# Altium schematic symbol library AliPadash.SchLib: 1186 symbols (part 3 of 6)
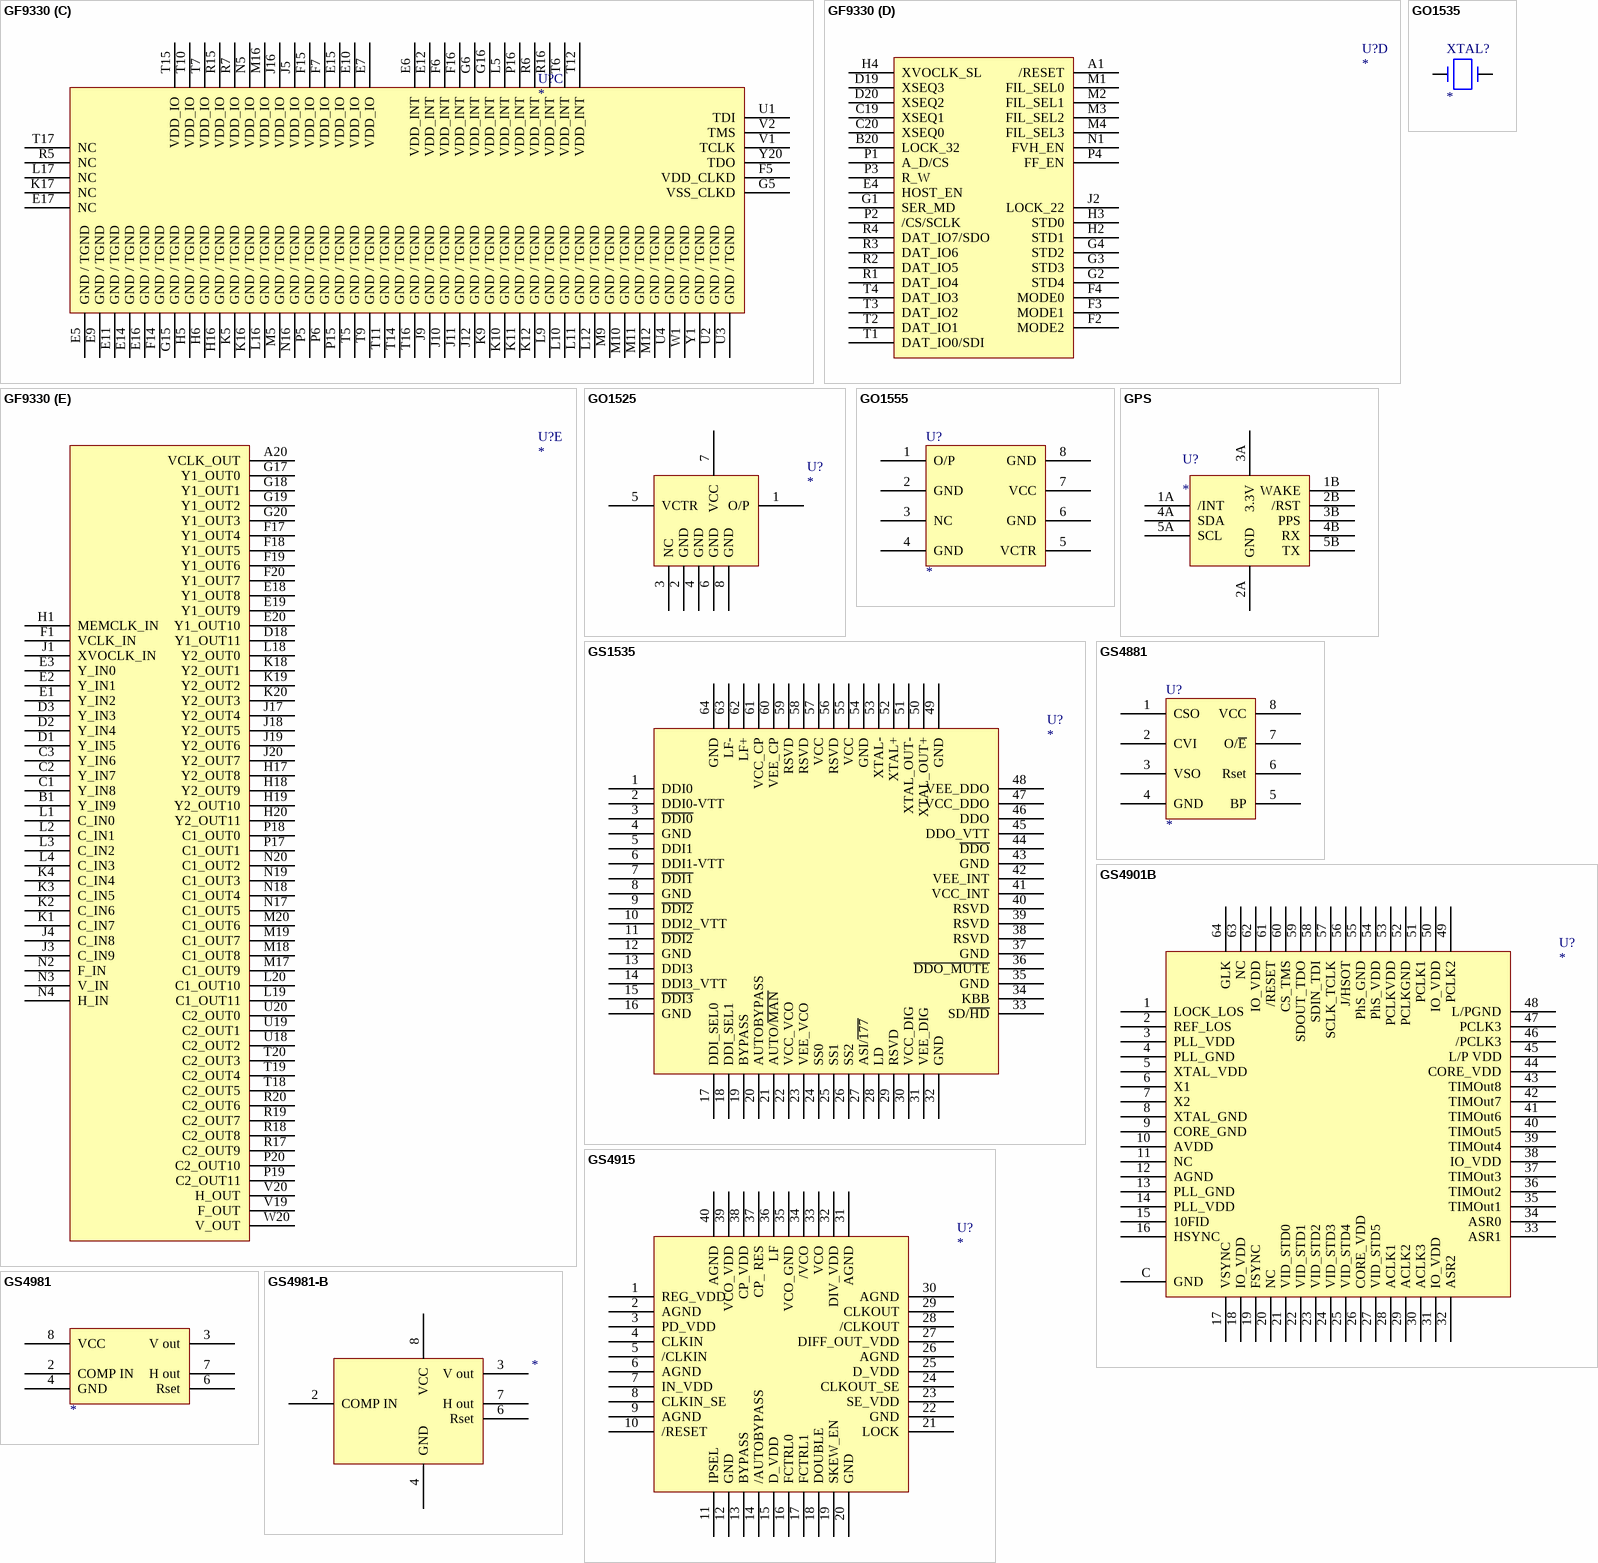
[diagram p88: symbols GF9330 to GS4981-B]

## GF9330
designator U?
footprint BGA320X20
part A pins: T8 S1_DAT41, T13 S1_DAT25, U5 S1_ADDR6, U6 S1_ADDR2, U7 S1_DAT46, U8 S1_DAT42, U9 S1_DAT37, U10 S1_DAT34, U11 S1_DAT33, U12 S1_DAT29, U13 S1_DAT24, U14 S1_DAT20, U15 S1_DAT16, U16 S1_DAT12, U17 S1_DAT8, V3 S1_ADDR13, V4 S1_ADDR10, V5 S1_ADDR7, V6 S1_ADDR3, V7 S1_DAT47, V8 S1_DAT43, V9 S1_DAT38, V10 S1_DAT35, V11 S1_DAT32, V12 S1_DAT28, V13 S1_DAT23, V14 S1_DAT19, V15 S1_DAT15, V16 S1_DAT11, V17 S1_DAT7, V18 S1_DAT4, W2 /S1_RAS, W3 /S1_CAS, W4 S1_ADDR11, W5 S1_ADDR8, W6 S1_ADDR4, W7 S1_ADDR0, W8 S1_DAT44, W9 S1_DAT39, W10 S1_DAT36, W11 S1_DAT31, W12 S1_DAT27, W13 S1_DAT22, W14 S1_DAT18, W15 S1_DAT14, W16 S1_DAT10, W17 S1_DAT6, W18 S1_DAT3, W19 S1_DAT1, Y2 /S1_WE, Y3 /S1_CS, Y4 S1_ADDR12, Y5 S1_ADDR9, Y6 S1_ADDR5, Y7 S1_ADDR1, Y8 S1_DAT45, Y9 S1_DAT40, Y10 S1_CLK, Y11 S1_DAT30, Y12 S1_DAT26, Y13 S1_DAT21, Y14 S1_DAT17, Y15 S1_DAT13, Y16 S1_DAT9, Y17 S1_DAT5, Y18 S1_DAT2, Y19 S1_DAT0
part B pins: A2 S2_DAT0, A3 S2_DAT2, A4 S2_DAT4, A5 S2_DAT8, A6 S2_DAT12, A7 S2_DAT16, A8 S2_DAT20, A9 S2_DAT25, A10 S2_DAT29, A11 S2_DAT36, A12 S2_CLK, A13 S2_DAT44, A14 S2_ADDR0, A15 S2_ADDR4, A16 S2_ADDR8, A17 S2_ADDR12, A18 /S2_CS, A19 /S2_WE, B2 S2_DAT1, B3 S2_DAT3, B4 S2_DAT5, B5 S2_DAT9, B6 S2_DAT13, B7 S2_DAT17, B8 S2_DAT21, B9 S2_DAT26, B10 S2_DAT30, B11 S2_DAT35, B12 S2_DAT39, B13 S2_DAT43, B14 S2_DAT47, B15 S2_ADDR3, B16 S2_ADDR7, B17 S2_ADDR11, B18 /S2_CAS, B19 /S2_RAS, C4 S2_DAT6, C5 S2_DAT10, C6 S2_DAT14, C7 S2_DAT18, C8 S2_DAT22, C9 S2_DAT27, C10 S2_DAT31, C11 S2_DAT34, C12 S2_DAT38, C13 S2_DAT42, C14 S2_DAT46, C15 S2_ADDR2, C16 S2_ADDR6, C17 S2_ADDR10, C18 S2_ADDR13, D4 S2_DAT7, D5 S2_DAT11, D6 S2_DAT15, D7 S2_DAT19, D8 S2_DAT23, D9 S2_DAT28, D10 S2_DAT32, D11 S2_DAT33, D12 S2_DAT37, D13 S2_DAT41, D14 S2_DAT45, D15 S2_ADDR1, D16 S2_ADDR5, D17 S2_ADDR9, E8 S2_DAT24, E13 S2_DAT40
part C pins: E5 GND / TGND, E6 VDD_INT, E7 VDD_IO, E9 GND / TGND, E10 VDD_IO, E11 GND / TGND, E12 VDD_INT, E14 GND / TGND, E15 VDD_IO, E16 GND / TGND, E17 NC, F5 VDD_CLKD, F6 VDD_INT, F7 VDD_IO, F14 GND / TGND, F15 VDD_IO, F16 VDD_INT, G5 VSS_CLKD, G6 VDD_INT, G15 GND / TGND, G16 VDD_INT, H5 GND / TGND, H6 GND / TGND, H16 GND / TGND, J5 VDD_IO, J9 GND / TGND, J10 GND / TGND, J11 GND / TGND, J12 GND / TGND, J16 VDD_IO, K5 GND / TGND, K9 GND / TGND, K10 GND / TGND, K11 GND / TGND, K12 GND / TGND, K16 GND / TGND, K17 NC, L5 VDD_INT, L9 GND / TGND, L10 GND / TGND, L11 GND / TGND, L12 GND / TGND, L16 GND / TGND, L17 NC, M5 GND / TGND, M9 GND / TGND, M10 GND / TGND, M11 GND / TGND, M12 GND / TGND, M16 VDD_IO, N5 VDD_IO, N16 GND / TGND, P5 GND / TGND, P6 GND / TGND, P15 GND / TGND, P16 VDD_INT, R5 NC, R6 VDD_INT, R7 VDD_IO, R15 VDD_IO, R16 VDD_INT, T5 GND / TGND, T6 VDD_INT, T7 VDD_IO, T9 GND / TGND, T10 VDD_IO, T11 GND / TGND, T12 VDD_INT, T14 GND / TGND, T15 VDD_IO, T16 GND / TGND, T17 NC, U1 TDI, U2 GND / TGND, U3 GND / TGND, U4 GND / TGND, V1 TCLK, V2 TMS, W1 GND / TGND, Y1 GND / TGND, Y20 TDO
part D pins: A1 /RESET, B20 LOCK_32, C19 XSEQ1, C20 XSEQ0, D19 XSEQ3, D20 XSEQ2, E4 HOST_EN, F2 MODE2, F3 MODE1, F4 MODE0, G1 SER_MD, G2 STD4, G3 STD3, G4 STD2, H2 STD1, H3 STD0, H4 XVOCLK_SL, J2 LOCK_22, M1 FIL_SEL0, M2 FIL_SEL1, M3 FIL_SEL2, M4 FIL_SEL3, N1 FVH_EN, P1 A_D/CS, P2 /CS/SCLK, P3 R_W, P4 FF_EN, R1 DAT_IO4, R2 DAT_IO5, R3 DAT_IO6, R4 DAT_IO7/SDO, T1 DAT_IO0/SDI, T2 DAT_IO1, T3 DAT_IO2, T4 DAT_IO3
part E pins: A20 VCLK_OUT, B1 Y_IN9, C1 Y_IN8, C2 Y_IN7, C3 Y_IN6, D1 Y_IN5, D2 Y_IN4, D3 Y_IN3, D18 Y1_OUT11, E1 Y_IN2, E2 Y_IN1, E3 Y_IN0, E18 Y1_OUT8, E19 Y1_OUT9, E20 Y1_OUT10, F1 VCLK_IN, F17 Y1_OUT4, F18 Y1_OUT5, F19 Y1_OUT6, F20 Y1_OUT7, G17 Y1_OUT0, G18 Y1_OUT1, G19 Y1_OUT2, G20 Y1_OUT3, H1 MEMCLK_IN, H17 Y2_OUT8, H18 Y2_OUT9, H19 Y2_OUT10, H20 Y2_OUT11, J1 XVOCLK_IN, J3 C_IN9, J4 C_IN8, J17 Y2_OUT4, J18 Y2_OUT5, J19 Y2_OUT6, J20 Y2_OUT7, K1 C_IN7, K2 C_IN6, K3 C_IN5, K4 C_IN4, K18 Y2_OUT1, K19 Y2_OUT2, K20 Y2_OUT3, L1 C_IN0, L2 C_IN1, L3 C_IN2, L4 C_IN3, L18 Y2_OUT0, L19 C1_OUT11, L20 C1_OUT10, M17 C1_OUT9, M18 C1_OUT8, M19 C1_OUT7, M20 C1_OUT6, N2 F_IN, N3 V_IN, N4 H_IN, N17 C1_OUT5, N18 C1_OUT4, N19 C1_OUT3, N20 C1_OUT2, P17 C1_OUT1, P18 C1_OUT0, P19 C2_OUT11, P20 C2_OUT10, R17 C2_OUT9, R18 C2_OUT8, R19 C2_OUT7, R20 C2_OUT6, T18 C2_OUT5, T19 C2_OUT4, T20 C2_OUT3, U18 C2_OUT2, U19 C2_OUT1, U20 C2_OUT0, V19 F_OUT, V20 H_OUT, W20 V_OUT

## GO1525
designator U?
footprint TOR-8
pins: 1 O/P, 2 GND, 3 NC, 4 GND, 5 VCTR, 6 GND, 7 VCC, 8 GND

## GO1535
designator XTAL?
footprint GO4
pins: 1, 3

## GO1555
designator U?
footprint PSML8
pins: 1 O/P, 2 GND, 3 NC, 4 GND, 5 VCTR, 6 GND, 7 VCC, 8 GND

## GPS
designator U?
footprint GPS-QWIIC
pins: 1A /INT, 1B WAKE, 2A GND, 2B /RST, 3A 3.3V, 3B PPS, 4A SDA, 4B RX, 5A SCL, 5B TX

## GS1535
designator U?
footprint ST-64B
pins: 1 DDI0, 2 DDI0-VTT, 3 ~{DDI0}, 4 GND, 5 DDI1, 6 DDI1-VTT, 7 ~{DDI1}, 8 GND, 9 ~{DDI2}, 10 DDI2_VTT, 11 ~{DDI2}, 12 GND, 13 DDI3, 14 DDI3_VTT, 15 ~{DDI3}, 16 GND, 17 DDI_SEL0, 18 DDI_SEL1, 19 BYPASS, 20 AUTOBYPASS, 21 AUTO/~{MAN}, 22 VCC_VCO, 23 VEE_VCO, 24 SS0, 25 SS1, 26 SS2, 27 ASI/~{177}, 28 LD, 29 RSVD, 30 VCC_DIG, 31 VEE_DIG, 32 GND, 33 SD/~{HD}, 34 KBB, 35 GND, 36 ~{DDO_MUTE}, 37 GND, 38 RSVD, 39 RSVD, 40 RSVD, 41 VCC_INT, 42 VEE_INT, 43 GND, 44 ~{DDO}, 45 DDO_VTT, 46 DDO, 47 VCC_DDO, 48 VEE_DDO, 49 GND, 50 XTAL_OUT+, 51 XTAL_OUT-, 52 XTAL+, 53 XTAL-, 54 GND, 55 VCC, 56 RSVD, 57 VCC, 58 RSVD, 59 RSVD, 60 VEE_CP, 61 VCC_CP, 62 LF+, 63 LF-, 64 GND

## GS4881
designator U?
footprint DIP8
pins: 1 CSO, 2 CVI, 3 VSO, 4 GND, 5 BP, 6 Rset, 7 O/~{E}, 8 VCC

## GS4901B
designator U?
footprint QFN64
pins: 1 LOCK_LOS, 2 REF_LOS, 3 PLL_VDD, 4 PLL_GND, 5 XTAL_VDD, 6 X1, 7 X2, 8 XTAL_GND, 9 CORE_GND, 10 AVDD, 11 NC, 12 AGND, 13 PLL_GND, 14 PLL_VDD, 15 10FID, 16 HSYNC, 17 VSYNC, 18 IO_VDD, 19 FSYNC, 20 NC, 21 VID_STD0, 22 VID_STD1, 23 VID_STD2, 24 VID_STD3, 25 VID_STD4, 26 CORE_VDD, 27 VID_STD5, 28 ACLK1, 29 ACLK2, 30 ACLK3, 31 IO_VDD, 32 ASR2, 33 ASR1, 34 ASR0, 35 TIMOut1, 36 TIMOut2, 37 TIMOut3, 38 IO_VDD, 39 TIMOut4, 40 TIMOut5, 41 TIMOut6, 42 TIMOut7, 43 TIMOut8, 44 CORE_VDD, 45 L/P VDD, 46 /PCLK3, 47 PCLK3, 48 L/PGND, 49 PCLK2, 50 IO_VDD, 51 PCLK1, 52 PCLKGND, 53 PCLKVDD, 54 PhS_VDD, 55 PhS_GND, 56 J/HSOT, 57 SCLK_TCLK, 58 SDIN_TDI, 59 SDOUT_TDO, 60 CS_TMS, 61 /RESET, 62 IO_VDD, 63 NC, 64 GLK, C GND

## GS4915
designator U?
footprint QFN40
pins: 1 REG_VDD, 2 AGND, 3 PD_VDD, 4 CLKIN, 5 /CLKIN, 6 AGND, 7 IN_VDD, 8 CLKIN_SE, 9 AGND, 10 /RESET, 11 IPSEL, 12 GND, 13 BYPASS, 14 /AUTOBYPASS, 15 D_VDD, 16 FCTRL0, 17 FCTRL1, 18 DOUBLE, 19 SKEW_EN, 20 GND, 21 LOCK, 22 GND, 23 SE_VDD, 24 CLKOUT_SE, 25 D_VDD, 26 AGND, 27 DIFF_OUT_VDD, 28 /CLKOUT, 29 CLKOUT, 30 AGND, 31 AGND, 32 DIV_VDD, 33 VCO, 34 /VCO, 35 VCO_GND, 36 LF, 37 CP_ RES, 38 CP_VDD, 39 VCO_VDD, 40 AGND

## GS4981
designator ?
pins: 2 COMP IN, 3 V out, 4 GND, 6 Rset, 7 H out, 8 VCC

## GS4981-B
designator ?
pins: 2 COMP IN, 3 V out, 4 GND, 6 Rset, 7 H out, 8 VCC

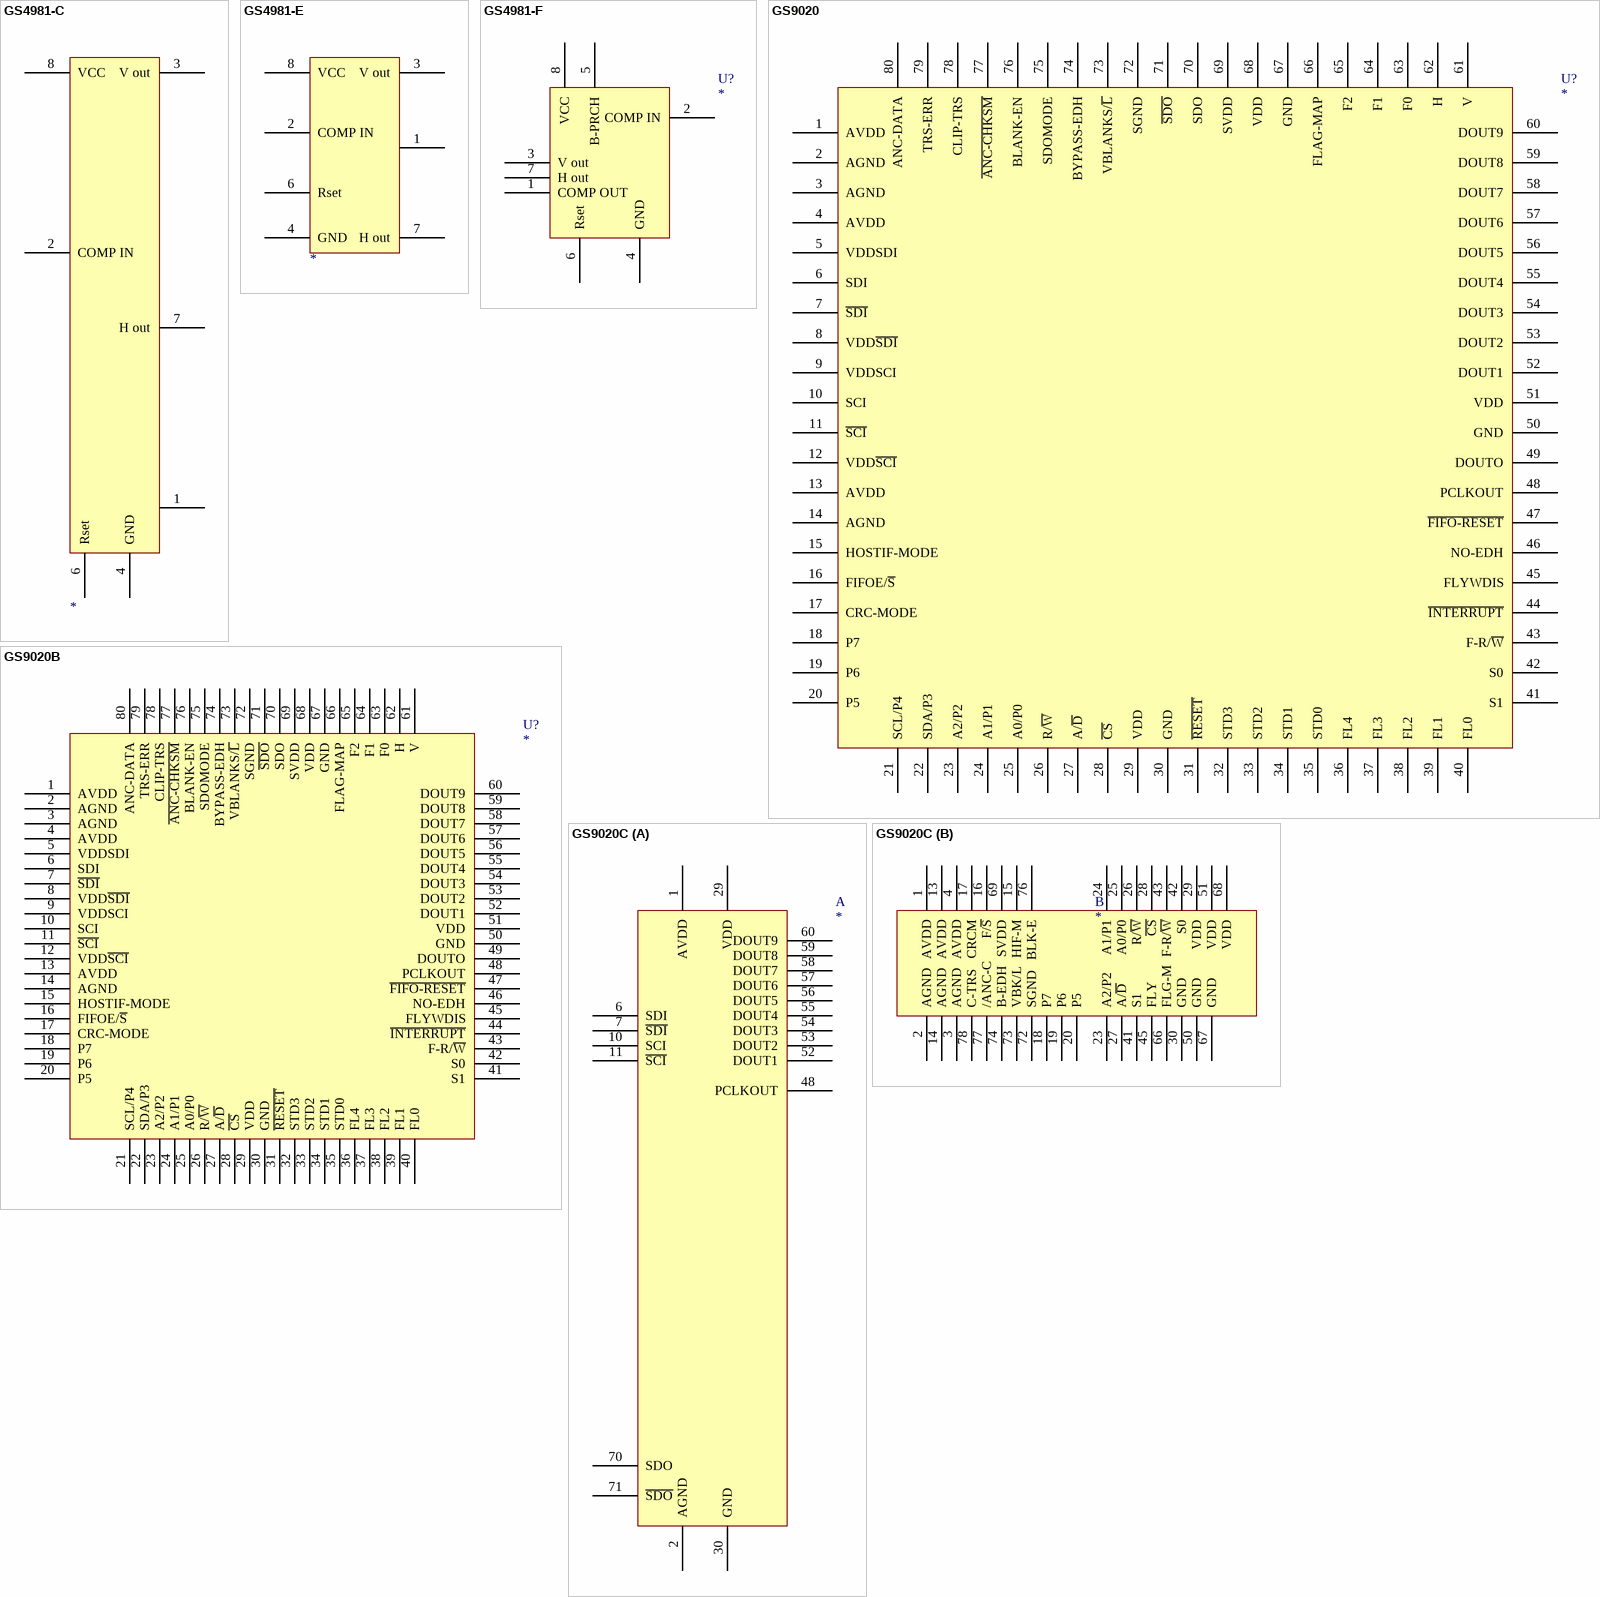
[diagram p28: symbols GS4981-C to GS9020C]

## GS4981-C
designator ?
pins: 1, 2 COMP IN, 3 V out, 4 GND, 6 Rset, 7 H out, 8 VCC

## GS4981-E
designator ?
pins: 1, 2 COMP IN, 3 V out, 4 GND, 6 Rset, 7 H out, 8 VCC

## GS4981-F
designator U?
pins: 1 COMP OUT, 2 COMP IN, 3 V out, 4 GND, 5 B-PRCH, 6 Rset, 7 H out, 8 VCC

## GS9020
designator U?
footprint TQFP80-A
pins: 1 AVDD (power), 2 AGND (power), 3 AGND (power), 4 AVDD (power), 5 VDDSDI, 6 SDI, 7 ~{SDI}, 8 VDD~{SDI}, 9 VDDSCI, 10 SCI, 11 ~{SCI}, 12 VDD~{SCI}, 13 AVDD (power), 14 AGND (power), 15 HOSTIF-MODE, 16 FIFOE/~{S}, 17 CRC-MODE, 18 P7, 19 P6, 20 P5, 21 SCL/P4, 22 SDA/P3, 23 A2/P2, 24 A1/P1, 25 A0/P0, 26 R/~{W}, 27 A/~{D}, 28 ~{CS}, 29 VDD (power), 30 GND (power), 31 ~{RESET}, 32 STD3, 33 STD2, 34 STD1, 35 STD0, 36 FL4, 37 FL3, 38 FL2, 39 FL1, 40 FL0, 41 S1, 42 S0, 43 F-R/~{W}, 44 ~{INTERRUPT}, 45 FLYWDIS, 46 NO-EDH, 47 ~{FIFO-RESET}, 48 PCLKOUT, 49 DOUTO, 50 GND (power), 51 VDD (power), 52 DOUT1, 53 DOUT2, 54 DOUT3, 55 DOUT4, 56 DOUT5, 57 DOUT6, 58 DOUT7, 59 DOUT8, 60 DOUT9, 61 V, 62 H, 63 F0, 64 F1, 65 F2, 66 FLAG-MAP, 67 GND (power), 68 VDD (power), 69 SVDD, 70 SDO, 71 ~{SDO}, 72 SGND, 73 VBLANKS/~{L}, 74 BYPASS-EDH, 75 SDOMODE, 76 BLANK-EN, 77 ~{ANC-CHKSM}, 78 CLIP-TRS, 79 TRS-ERR, 80 ANC-DATA

## GS9020B
designator U?
footprint TQFP80-A
pins: 1 AVDD (power), 2 AGND (power), 3 AGND (power), 4 AVDD (power), 5 VDDSDI, 6 SDI, 7 ~{SDI}, 8 VDD~{SDI}, 9 VDDSCI, 10 SCI, 11 ~{SCI}, 12 VDD~{SCI}, 13 AVDD (power), 14 AGND (power), 15 HOSTIF-MODE, 16 FIFOE/~{S}, 17 CRC-MODE, 18 P7, 19 P6, 20 P5, 21 SCL/P4, 22 SDA/P3, 23 A2/P2, 24 A1/P1, 25 A0/P0, 26 R/~{W}, 27 A/~{D}, 28 ~{CS}, 29 VDD (power), 30 GND (power), 31 ~{RESET}, 32 STD3, 33 STD2, 34 STD1, 35 STD0, 36 FL4, 37 FL3, 38 FL2, 39 FL1, 40 FL0, 41 S1, 42 S0, 43 F-R/~{W}, 44 ~{INTERRUPT}, 45 FLYWDIS, 46 NO-EDH, 47 ~{FIFO-RESET}, 48 PCLKOUT, 49 DOUTO, 50 GND (power), 51 VDD (power), 52 DOUT1, 53 DOUT2, 54 DOUT3, 55 DOUT4, 56 DOUT5, 57 DOUT6, 58 DOUT7, 59 DOUT8, 60 DOUT9, 61 V, 62 H, 63 F0, 64 F1, 65 F2, 66 FLAG-MAP, 67 GND (power), 68 VDD (power), 69 SVDD, 70 SDO, 71 ~{SDO}, 72 SGND, 73 VBLANKS/~{L}, 74 BYPASS-EDH, 75 SDOMODE, 76 BLANK-EN, 77 ~{ANC-CHKSM}, 78 CLIP-TRS, 79 TRS-ERR, 80 ANC-DATA

## GS9020C
designator ?
part A pins: 1 AVDD (power), 2 AGND (power), 6 SDI, 7 ~{SDI}, 10 SCI, 11 ~{SCI}, 29 VDD (power), 30 GND (power), 48 PCLKOUT, 52 DOUT1, 53 DOUT2, 54 DOUT3, 55 DOUT4, 56 DOUT5, 57 DOUT6, 58 DOUT7, 59 DOUT8, 60 DOUT9, 70 SDO, 71 ~{SDO}
part B pins: 1 AVDD (power), 2 AGND (power), 3 AGND (power), 4 AVDD (power), 13 AVDD (power), 14 AGND (power), 15 HIF-M, 16 F/~{S}, 17 CRCM, 18 P7, 19 P6, 20 P5, 23 A2/P2, 24 A1/P1, 25 A0/P0, 26 R/~{W}, 27 A/~{D}, 28 ~{CS}, 29 VDD (power), 30 GND (power), 41 S1, 42 S0, 43 F-R/~{W}, 45 FLY, 50 GND (power), 51 VDD (power), 66 FLG-M, 67 GND (power), 68 VDD (power), 69 SVDD, 72 SGND, 73 VBK/L, 74 B-EDH, 76 BLK-E, 77 /ANC-C, 78 C-TRS

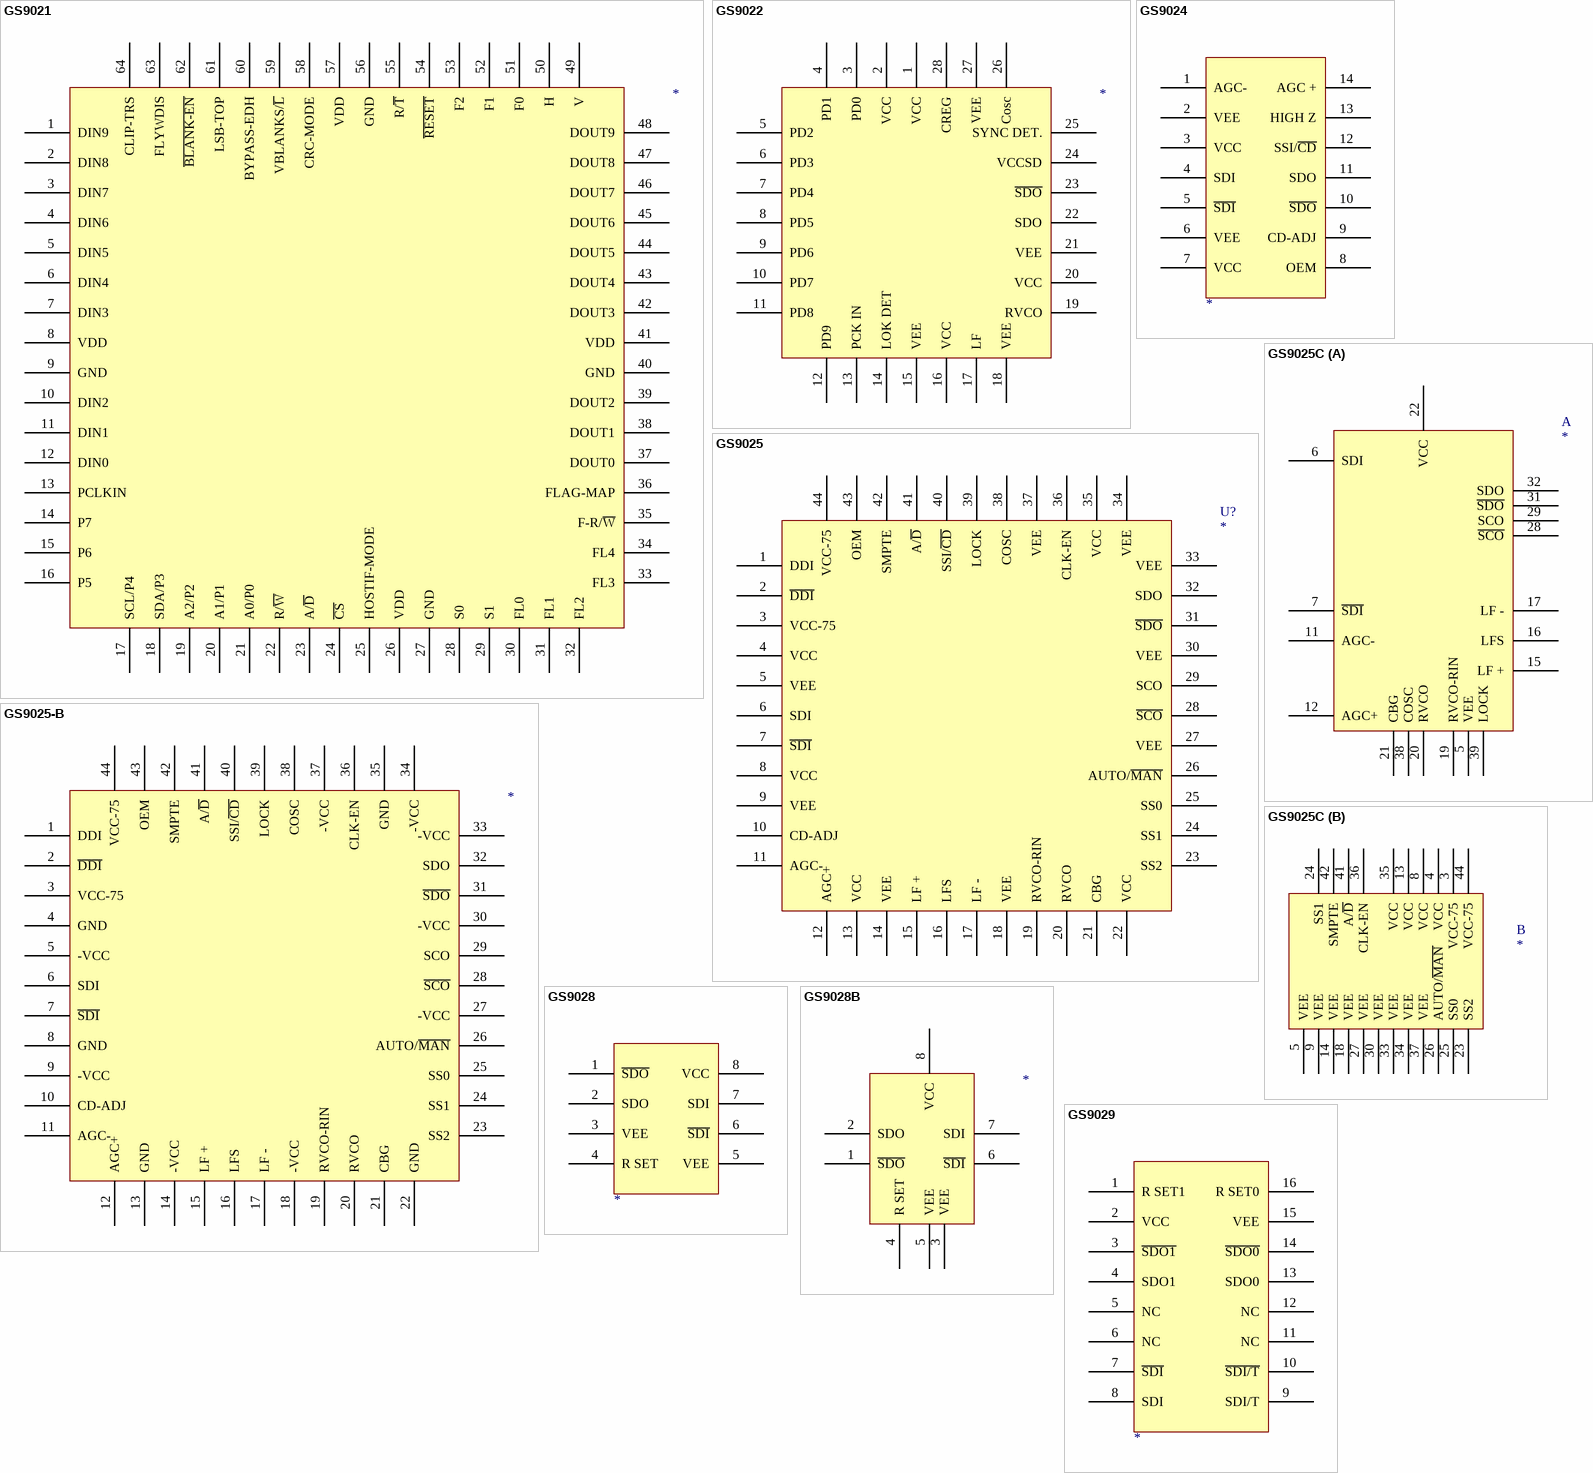
[diagram p29: symbols GS9021 to GS9029]

## GS9021
designator ?
U?
footprint LQFP64
pins: 1 DIN9, 2 DIN8, 3 DIN7, 4 DIN6, 5 DIN5, 6 DIN4, 7 DIN3, 8 VDD (power), 9 GND (power), 10 DIN2, 11 DIN1, 12 DIN0, 13 PCLKIN, 14 P7, 15 P6, 16 P5, 17 SCL/P4, 18 SDA/P3, 19 A2/P2, 20 A1/P1, 21 A0/P0, 22 R/~{W}, 23 A/~{D}, 24 ~{CS}, 25 HOSTIF-MODE, 26 VDD (power), 27 GND (power), 28 S0, 29 S1, 30 FL0, 31 FL1, 32 FL2, 33 FL3, 34 FL4, 35 F-R/~{W}, 36 FLAG-MAP, 37 DOUT0, 38 DOUT1, 39 DOUT2, 40 GND (power), 41 VDD (power), 42 DOUT3, 43 DOUT4, 44 DOUT5, 45 DOUT6, 46 DOUT7, 47 DOUT8, 48 DOUT9, 49 V, 50 H, 51 F0, 52 F1, 53 F2, 54 ~{RESET}, 55 R/~{T}, 56 GND (power), 57 VDD (power), 58 CRC-MODE, 59 VBLANKS/~{L}, 60 BYPASS-EDH, 61 LSB-TOP, 62 ~{BLANK-EN}, 63 FLYWDIS, 64 CLIP-TRS

## GS9022
designator ?
U?
footprint PLCC28
pins: 1 VCC (power), 2 VCC (power), 3 PD0, 4 PD1, 5 PD2, 6 PD3, 7 PD4, 8 PD5, 9 PD6, 10 PD7, 11 PD8, 12 PD9, 13 PCK IN, 14 LOK DET, 15 VEE (power), 16 VCC (power), 17 LF, 18 VEE (power), 19 RVCO, 20 VCC (power), 21 VEE (power), 22 SDO, 23 ~{SDO}, 24 VCCSD, 25 SYNC DET., 26 Cosc, 27 VEE (power), 28 CREG

## GS9024
designator ?
U?
pins: 1 AGC-, 2 VEE, 3 VCC (power), 4 SDI, 5 ~{SDI}, 6 VEE, 7 VCC (power), 8 OEM, 9 CD-ADJ, 10 ~{SDO}, 11 SDO, 12 SSI/~{CD}, 13 HIGH Z, 14 AGC +

## GS9025
designator U?
footprint LQFP44
pins: 1 DDI, 2 ~{DDI}, 3 VCC-75, 4 VCC (power), 5 VEE (power), 6 SDI, 7 ~{SDI}, 8 VCC (power), 9 VEE (power), 10 CD-ADJ, 11 AGC-, 12 AGC+, 13 VCC (power), 14 VEE (power), 15 LF +, 16 LFS, 17 LF -, 18 VEE (power), 19 RVCO-RIN, 20 RVCO, 21 CBG, 22 VCC (power), 23 SS2, 24 SS1, 25 SS0, 26 AUTO/~{MAN}, 27 VEE (power), 28 ~{SCO}, 29 SCO, 30 VEE (power), 31 ~{SDO}, 32 SDO, 33 VEE (power), 34 VEE (power), 35 VCC (power), 36 CLK-EN, 37 VEE (power), 38 COSC, 39 LOCK, 40 SSI/~{CD}, 41 A/~{D}, 42 SMPTE, 43 OEM, 44 VCC-75

## GS9025-B
designator ?
pins: 1 DDI, 2 ~{DDI}, 3 VCC-75, 4 GND (power), 5 -VCC (power), 6 SDI, 7 ~{SDI}, 8 GND (power), 9 -VCC (power), 10 CD-ADJ, 11 AGC-, 12 AGC+, 13 GND (power), 14 -VCC (power), 15 LF +, 16 LFS, 17 LF -, 18 -VCC (power), 19 RVCO-RIN, 20 RVCO, 21 CBG, 22 GND (power), 23 SS2, 24 SS1, 25 SS0, 26 AUTO/~{MAN}, 27 -VCC (power), 28 ~{SCO}, 29 SCO, 30 -VCC (power), 31 ~{SDO}, 32 SDO, 33 -VCC (power), 34 -VCC (power), 35 GND (power), 36 CLK-EN, 37 -VCC (power), 38 COSC, 39 LOCK, 40 SSI/~{CD}, 41 A/~{D}, 42 SMPTE, 43 OEM, 44 VCC-75

## GS9025C
designator ?
part A pins: 5 VEE (power), 6 SDI, 7 ~{SDI}, 11 AGC-, 12 AGC+, 15 LF +, 16 LFS, 17 LF -, 19 RVCO-RIN, 20 RVCO, 21 CBG, 22 VCC (power), 28 ~{SCO}, 29 SCO, 31 ~{SDO}, 32 SDO, 38 COSC, 39 LOCK
part B pins: 3 VCC-75, 4 VCC (power), 5 VEE (power), 8 VCC (power), 9 VEE (power), 13 VCC (power), 14 VEE (power), 18 VEE (power), 23 SS2, 24 SS1, 25 SS0, 26 AUTO/~{MAN}, 27 VEE (power), 30 VEE (power), 33 VEE (power), 34 VEE (power), 35 VCC (power), 36 CLK-EN, 37 VEE (power), 41 A/~{D}, 42 SMPTE, 44 VCC-75

## GS9028
designator ?
U?
pins: 1 ~{SDO}, 2 SDO, 3 VEE (power), 4 R SET, 5 VEE (power), 6 ~{SDI}, 7 SDI, 8 VCC (power)

## GS9028B
designator ?
U?
pins: 1 ~{SDO}, 2 SDO, 3 VEE (power), 4 R SET, 5 VEE (power), 6 ~{SDI}, 7 SDI, 8 VCC (power)

## GS9029
designator ?
U?
pins: 1 R SET1, 2 VCC (power), 3 ~{SDO1}, 4 SDO1, 5 NC, 6 NC, 7 ~{SDI}, 8 SDI, 9 SDI/T, 10 ~{SDI/T}, 11 NC, 12 NC, 13 SDO0, 14 ~{SDO0}, 15 VEE (power), 16 R SET0

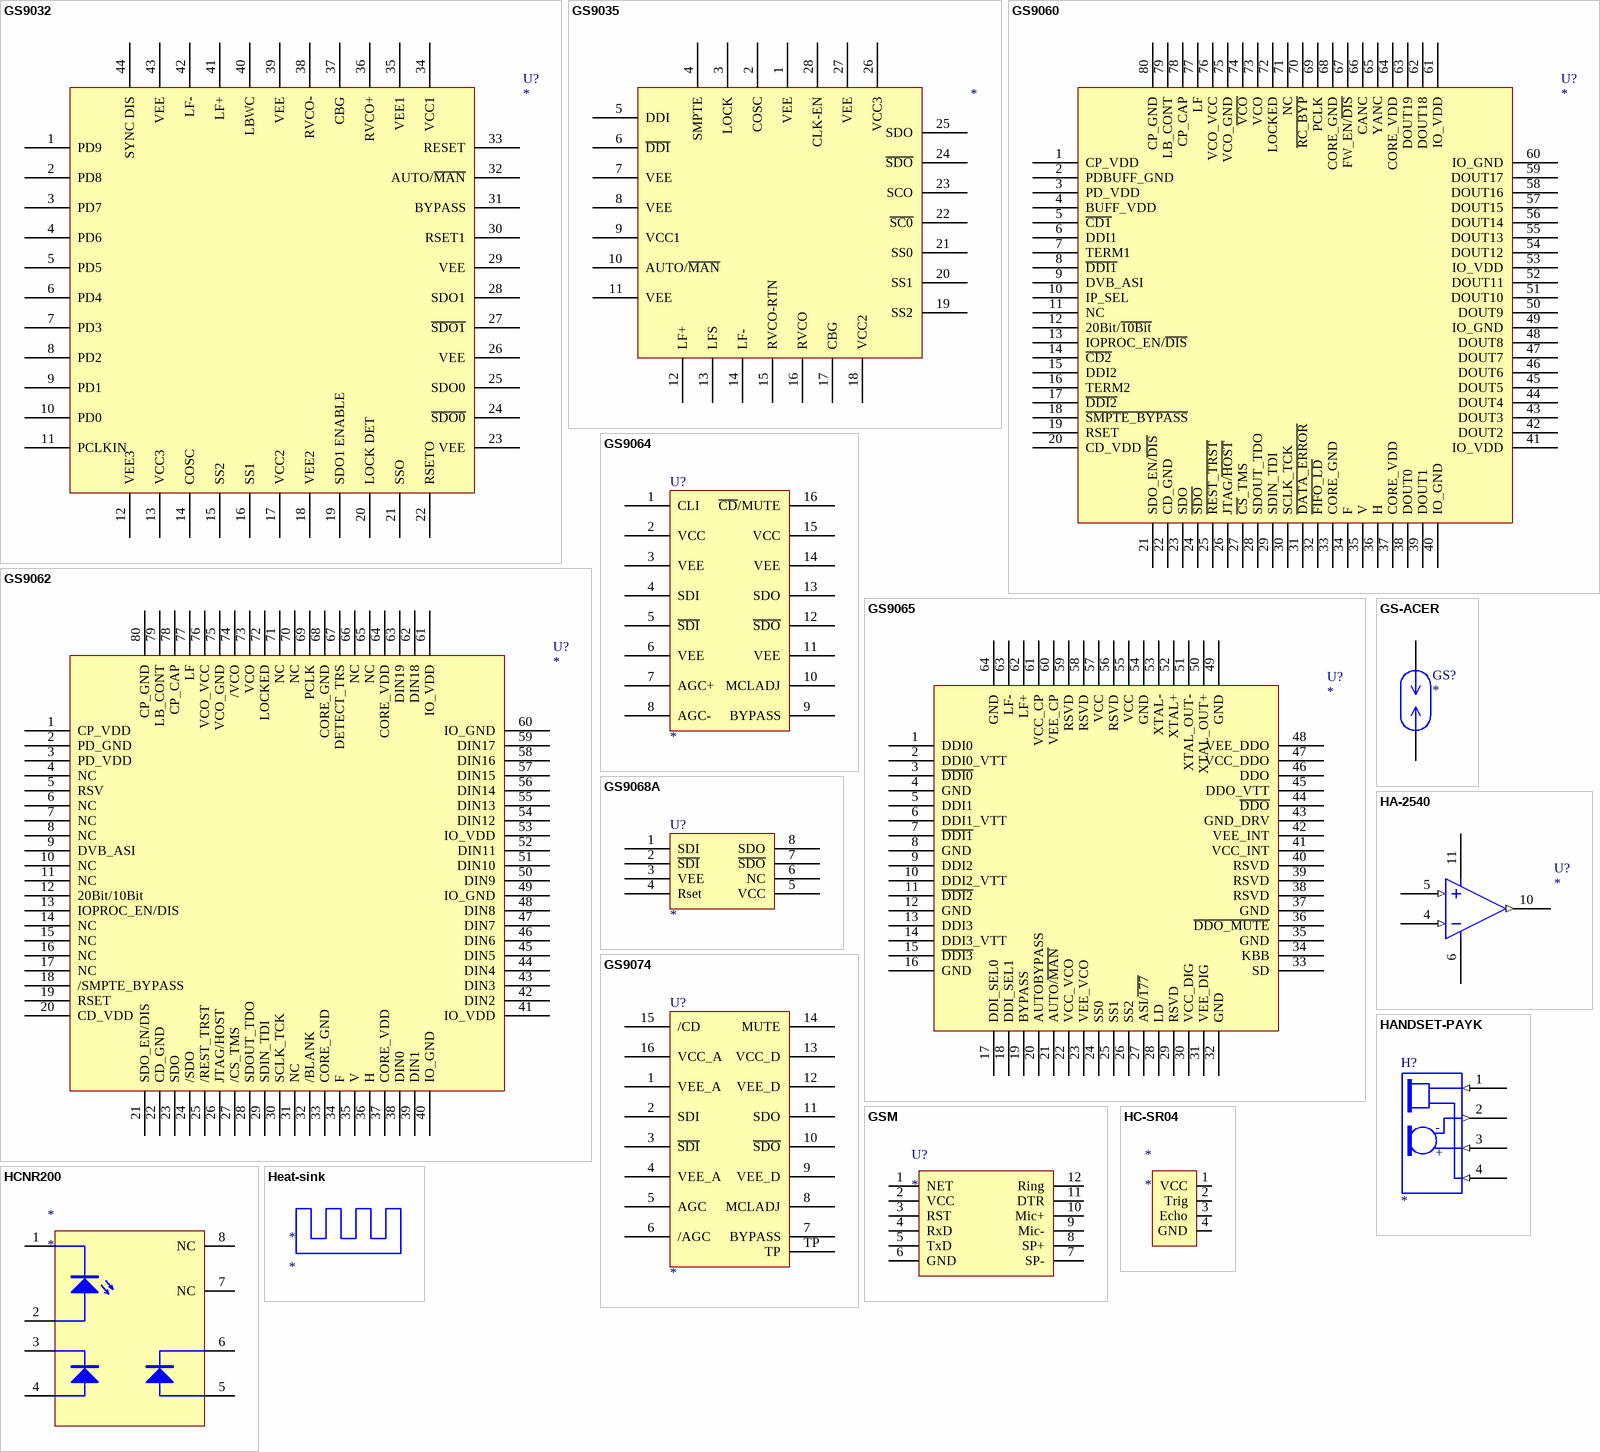
[diagram p30: symbols GS9032 to Heat-sink]

## GS9032
designator U?
footprint TQFP44
pins: 1 PD9, 2 PD8, 3 PD7, 4 PD6, 5 PD5, 6 PD4, 7 PD3, 8 PD2, 9 PD1, 10 PD0, 11 PCLKIN, 12 VEE3, 13 VCC3, 14 COSC, 15 SS2, 16 SS1, 17 VCC2 (power), 18 VEE2, 19 SDO1 ENABLE, 20 LOCK DET, 21 SSO, 22 RSETO, 23 VEE, 24 ~{SDO0}, 25 SDO0, 26 VEE, 27 ~{SDO1}, 28 SDO1, 29 VEE, 30 RSET1, 31 BYPASS, 32 AUTO/~{MAN}, 33 RESET, 34 VCC1 (power), 35 VEE1, 36 RVCO+, 37 CBG, 38 RVCO-, 39 VEE, 40 LBWC, 41 LF+, 42 LF-, 43 VEE, 44 SYNC DIS

## GS9035
designator ?
U?
pins: 1 VEE (power), 2 COSC, 3 LOCK, 4 SMPTE, 5 DDI, 6 ~{DDI}, 7 VEE (power), 8 VEE (power), 9 VCC1, 10 AUTO/~{MAN}, 11 VEE (power), 12 LF+, 13 LFS, 14 LF-, 15 RVCO-RTN, 16 RVCO, 17 CBG, 18 VCC2 (power), 19 SS2, 20 SS1, 21 SS0, 22 ~{SC0}, 23 SCO, 24 ~{SDO}, 25 SDO, 26 VCC3, 27 VEE (power), 28 CLK-EN

## GS9060
designator U?
footprint LQFP80B
pins: 1 CP_VDD, 2 PDBUFF_GND, 3 PD_VDD, 4 BUFF_VDD, 5 ~{CD1}, 6 DDI1, 7 TERM1, 8 ~{DDI1}, 9 DVB_ASI, 10 IP_SEL, 11 NC, 12 20Bit/~{10Bit}, 13 IOPROC_EN/~{DIS}, 14 ~{CD2}, 15 DDI2, 16 TERM2, 17 ~{DDI2}, 18 ~{SMPTE_BYPASS}, 19 RSET, 20 CD_VDD, 21 SDO_EN/~{DIS}, 22 CD_GND, 23 SDO, 24 ~{SDO}, 25 ~{REST_TRST}, 26 JTAG/~{HOST}, 27 ~{CS}_TMS, 28 SDOUT_TDO, 29 SDIN_TDI, 30 SCLK_TCK, 31 ~{DATA_ERROR}, 32 ~{FIFO_LD}, 33 CORE_GND, 34 F, 35 V, 36 H, 37 CORE_VDD, 38 DOUT0, 39 DOUT1, 40 IO_GND, 41 IO_VDD, 42 DOUT2, 43 DOUT3, 44 DOUT4, 45 DOUT5, 46 DOUT6, 47 DOUT7, 48 DOUT8, 49 IO_GND, 50 DOUT9, 51 DOUT10, 52 DOUT11, 53 IO_VDD, 54 DOUT12, 55 DOUT13, 56 DOUT14, 57 DOUT15, 58 DOUT16, 59 DOUT17, 60 IO_GND, 61 IO_VDD, 62 DOUT18, 63 DOUT19, 64 CORE_VDD, 65 YANC, 66 CANC, 67 FW_EN/~{DIS}, 68 CORE_GND, 69 PCLK, 70 ~{RC_BYP}, 71 NC, 72 LOCKED, 73 VCO, 74 ~{VCO}, 75 VCO_GND, 76 VCO_VCC, 77 LF, 78 CP_CAP, 79 LB_CONT, 80 CP_GND

## GS9062
designator U?
footprint LQFP80B
pins: 1 CP_VDD, 2 PD_GND, 3 PD_VDD, 4 NC, 5 RSV, 6 NC, 7 NC, 8 NC, 9 DVB_ASI, 10 NC, 11 NC, 12 20Bit/10Bit, 13 IOPROC_EN/DIS, 14 NC, 15 NC, 16 NC, 17 NC, 18 /SMPTE_BYPASS, 19 RSET, 20 CD_VDD, 21 SDO_EN/DIS, 22 CD_GND, 23 SDO, 24 /SDO, 25 /REST_TRST, 26 JTAG/HOST, 27 /CS_TMS, 28 SDOUT_TDO, 29 SDIN_TDI, 30 SCLK_TCK, 31 NC, 32 /BLANK, 33 CORE_GND, 34 F, 35 V, 36 H, 37 CORE_VDD, 38 DIN0, 39 DIN1, 40 IO_GND, 41 IO_VDD, 42 DIN2, 43 DIN3, 44 DIN4, 45 DIN5, 46 DIN6, 47 DIN7, 48 DIN8, 49 IO_GND, 50 DIN9, 51 DIN10, 52 DIN11, 53 IO_VDD, 54 DIN12, 55 DIN13, 56 DIN14, 57 DIN15, 58 DIN16, 59 DIN17, 60 IO_GND, 61 IO_VDD, 62 DIN18, 63 DIN19, 64 CORE_VDD, 65 NC, 66 NC, 67 DETECT_TRS, 68 CORE_GND, 69 PCLK, 70 NC, 71 NC, 72 LOCKED, 73 VCO, 74 /VCO, 75 VCO_GND, 76 VCO_VCC, 77 LF, 78 CP_CAP, 79 LB_CONT, 80 CP_GND

## GS9064
designator U?
footprint SO-16
pins: 1 CLI, 2 VCC, 3 VEE, 4 SDI, 5 ~{SDI}, 6 VEE, 7 AGC+, 8 AGC-, 9 BYPASS, 10 MCLADJ, 11 VEE, 12 ~{SDO}, 13 SDO, 14 VEE, 15 VCC, 16 ~{CD}/MUTE

## GS9065
designator U?
footprint ST-64B
pins: 1 DDI0, 2 DDI0_VTT, 3 ~{DDI0}, 4 GND, 5 DDI1, 6 DDI1_VTT, 7 ~{DDI1}, 8 GND, 9 DDI2, 10 DDI2_VTT, 11 ~{DDI2}, 12 GND, 13 DDI3, 14 DDI3_VTT, 15 ~{DDI3}, 16 GND, 17 DDI_SEL0, 18 DDI_SEL1, 19 BYPASS, 20 AUTOBYPASS, 21 AUTO/~{MAN}, 22 VCC_VCO, 23 VEE_VCO, 24 SS0, 25 SS1, 26 SS2, 27 ASI/~{177}, 28 LD, 29 RSVD, 30 VCC_DIG, 31 VEE_DIG, 32 GND, 33 SD, 34 KBB, 35 GND, 36 ~{DDO_MUTE}, 37 GND, 38 RSVD, 39 RSVD, 40 RSVD, 41 VCC_INT, 42 VEE_INT, 43 GND_DRV, 44 ~{DDO}, 45 DDO_VTT, 46 DDO, 47 VCC_DDO, 48 VEE_DDO, 49 GND, 50 XTAL_OUT+, 51 XTAL_OUT-, 52 XTAL+, 53 XTAL-, 54 GND, 55 VCC, 56 RSVD, 57 VCC, 58 RSVD, 59 RSVD, 60 VEE_CP, 61 VCC_CP, 62 LF+, 63 LF-, 64 GND

## GS9068A
designator U?
footprint SO-8
pins: 1 SDI, 2 ~{SDI}, 3 VEE, 4 Rset, 5 VCC, 6 NC, 7 ~{SDO}, 8 SDO

## GS9074
designator U?
footprint QFN16
pins: 1 VEE_A, 2 SDI, 3 ~{SDI}, 4 VEE_A, 5 AGC, 6 /AGC, 7 BYPASS, 8 MCLADJ, 9 VEE_D, 10 ~{SDO}, 11 SDO, 12 VEE_D, 13 VCC_D, 14 MUTE, 15 /CD, 16 VCC_A, TP

## GS-ACER
designator GS?
pins: 1, 2

## GSM
designator U?
pins: 1 NET, 2 VCC, 3 RST, 4 RxD, 5 TxD, 6 GND, 7 SP-, 8 SP+, 9 Mic-, 10 Mic+, 11 DTR, 12 Ring

## HA-2540
designator U?
pins: 4 -IN (in), 5 +IN (in), 6 V-, 10 OUT (out), 11 V+

## HANDSET-PAYK
designator H?
pins: 1 SPK1 (in), 2 -MIC (out), 3 +MIC (in), 4 SPK2 (in)
text: -; +

## HC-SR04
designator *
pins: 1 VCC, 2 Trig, 3 Echo, 4 GND

## HCNR200
designator *
footprint so-8-big (Footprint not found)
pins: 1, 2, 3, 4, 5, 6, 7 NC, 8 NC

## Heat-sink
designator *
